# Altium footprint library modules.PcbLib: 20 footprints (part 2 of 2)
Each footprint in its own frame and in the unit in brackets; x right, y up, seen from the top. Pads: shape width x height; smd on the part's side, far side on the other; paste and mask are expansions set on the pad; w line width, h text height; cw(c..) or ccw(c..) is an arc to the next point about the centre after c.
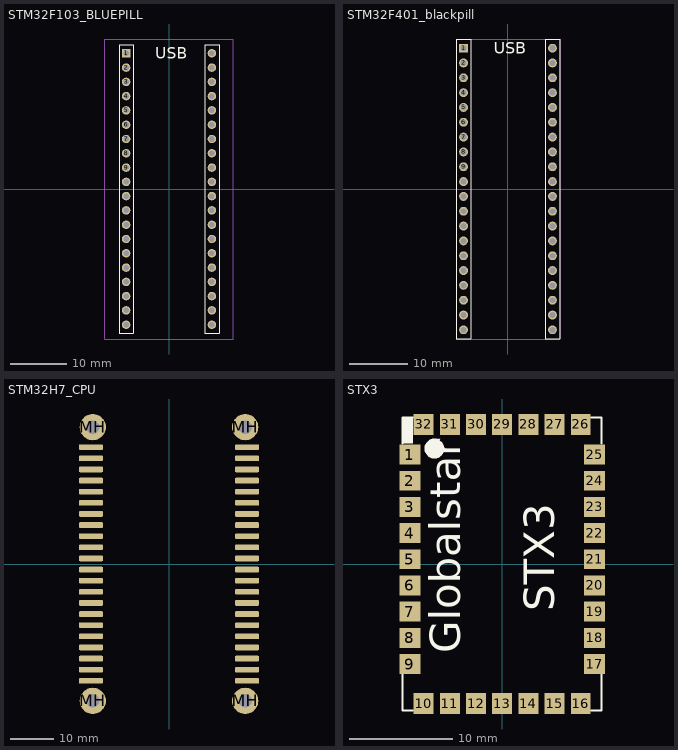
[diagram p1: the footprints below, top view; thin cyan lines are the x and y axes]

## STM32F103_BLUEPILL [mm]
pads (40):
  rect 1.508x1.508 hole 1: 1(-7.62,24.13)
  round 1.508 hole 1: 2(-7.62,21.59) 3(-7.62,19.05) 4(-7.62,16.51) 5(-7.62,13.97) 6(-7.62,11.43) 7(-7.62,8.89) 8(-7.62,6.35) 9(-7.62,3.81) 10(-7.62,1.27) 11(-7.62,-1.27) 12(-7.62,-3.81) 13(-7.62,-6.35) 14(-7.62,-8.89) 15(-7.62,-11.43) 16(-7.62,-13.97) 17(-7.62,-16.51) 18(-7.62,-19.05) 19(-7.62,-21.59) 20(-7.62,-24.13) 21(7.62,-24.13) 22(7.62,-21.59) 23(7.62,-19.05) 24(7.62,-16.51) 25(7.62,-13.97) 26(7.62,-11.43) 27(7.62,-8.89) 28(7.62,-6.35) 29(7.62,-3.81) 30(7.62,-1.27) 31(7.62,1.27) 32(7.62,3.81) 33(7.62,6.35) 34(7.62,8.89) 35(7.62,11.43) 36(7.62,13.97) 37(7.62,16.51) 38(7.62,19.05) 39(7.62,21.59) 40(7.62,24.13)
Top Overlay:
  lines w0.127: -8.89,-25.673 -8.89,25.688 -6.35,25.688 -6.35,-25.673 -8.89,-25.673 ; 6.35,-25.673 6.35,25.688 8.89,25.688 8.89,-25.673 6.35,-25.673
  text "USB" at -2.437,23.182 h2
Top Assembly (Mech13):
  lines w0.127: -11.43,-26.67 11.43,-26.67 11.43,26.67 -11.43,26.67 -11.43,-26.67
3D body "User Library-BluePill.X_B": height 16.51, standoff -0.92, extent -11.227,-31.648 11.273,26.988
3D body "User Library-PBS_(DS1023)_1line_connectors_h=5_0_8_5mm_step_2_54mm-1.STEP": height 5, standoff -3.3, extent -8.89,-25.65 -6.39,25.65
3D body "User Library-PBS_(DS1023)_1line_connectors_h=5_0_8_5mm_step_2_54mm-1.STEP": height 5, standoff -3.3, extent 6.39,-25.65 8.89,25.65

## STM32F401_blackpill [mm]
pads (40):
  rect 1.508x1.508 hole 1: 1(-7.62,24.13)
  round 1.508 hole 1: 2(-7.62,21.59) 3(-7.62,19.05) 4(-7.62,16.51) 5(-7.62,13.97) 6(-7.62,11.43) 7(-7.62,8.89) 8(-7.62,6.35) 9(-7.62,3.81) 10(-7.62,1.27) 11(-7.62,-1.27) 12(-7.62,-3.81) 13(-7.62,-6.35) 14(-7.62,-8.89) 15(-7.62,-11.43) 16(-7.62,-13.97) 17(-7.62,-16.51) 18(-7.62,-19.05) 19(-7.62,-21.59) 20(-7.62,-24.13) 21(7.62,-24.13) 22(7.62,-21.59) 23(7.62,-19.05) 24(7.62,-16.51) 25(7.62,-13.97) 26(7.62,-11.43) 27(7.62,-8.89) 28(7.62,-6.35) 29(7.62,-3.81) 30(7.62,-1.27) 31(7.62,1.27) 32(7.62,3.81) 33(7.62,6.35) 34(7.62,8.89) 35(7.62,11.43) 36(7.62,13.97) 37(7.62,16.51) 38(7.62,19.05) 39(7.62,21.59) 40(7.62,24.13)
Top Overlay:
  lines w0.127: -8.89,-25.673 -8.89,25.688 -6.35,25.688 -6.35,-25.673 -8.89,-25.673 ; 6.35,-25.673 6.35,25.688 8.89,25.688 8.89,-25.673 6.35,-25.673
  text "USB" at -2.437,23.182 h2
Top Assembly (Mech13):
  lines w0.127: -8.9,-25.7 -8.9,25.7 8.9,25.7 8.9,-25.7 -8.9,-25.7
3D body "User Library-BluePill.X_B": height 16.51, standoff -0.92, extent -11.227,-31.648 11.273,26.988
3D body "User Library-PBS_(DS1023)_1line_connectors_h=5_0_8_5mm_step_2_54mm-1.STEP": height 5, standoff -3.3, extent -8.89,-25.65 -6.39,25.65
3D body "User Library-PBS_(DS1023)_1line_connectors_h=5_0_8_5mm_step_2_54mm-1.STEP": height 5, standoff -3.3, extent 6.39,-25.65 8.89,25.65

## STM32H7_CPU [mm]
pads (92):
  rrect50% 3x1.3 smd: 1(-19.091,26.67) 2(-16.551,26.67) 3(-19.091,24.13) 4(-16.551,24.13) 5(-19.091,21.59) 6(-16.551,21.59) 7(-19.091,19.05) 8(-16.551,19.05) 9(-19.091,16.51) 10(-16.551,16.51) 11(-19.091,13.97) 12(-16.551,13.97) 13(-19.091,11.43) 14(-16.551,11.43) 15(-19.091,8.89) 16(-16.551,8.89) 17(-19.091,6.35) 18(-16.551,6.35) 19(-19.091,3.81) 20(-16.551,3.81) 21(-19.091,1.27) 22(-16.551,1.27) 23(-19.091,-1.27) 24(-16.551,-1.27) 25(-19.091,-3.81) 26(-16.551,-3.81) 27(-19.091,-6.35) 28(-16.551,-6.35) 29(-19.091,-8.89) 30(-16.551,-8.89) 31(-19.091,-11.43) 32(-16.551,-11.43) 33(-19.091,-13.97) 34(-16.551,-13.97) 35(-19.091,-16.51) 36(-16.551,-16.51) 37(-19.091,-19.05) 38(-16.551,-19.05) 39(-19.091,-21.59) 40(-16.551,-21.59) 41(-19.091,-24.13) 42(-16.551,-24.13) 43(-19.091,-26.67) 44(-16.551,-26.67) 45(16.551,26.67) 46(19.091,26.67) 47(16.551,24.13) 48(19.091,24.13) 49(16.551,21.59) 50(19.091,21.59) 51(16.551,19.05) 52(19.091,19.05) 53(16.551,16.51) 54(19.091,16.51) 55(16.551,13.97) 56(19.091,13.97) 57(16.551,11.43) 58(19.091,11.43) 59(16.551,8.89) 60(19.091,8.89) 61(16.551,6.35) 62(19.091,6.35) 63(16.551,3.81) 64(19.091,3.81) 65(16.551,1.27) 66(19.091,1.27) 67(16.551,-1.27) 68(19.091,-1.27) 69(16.551,-3.81) 70(19.091,-3.81) 71(16.551,-6.35) 72(19.091,-6.35) 73(16.551,-8.89) 74(19.091,-8.89) 75(16.551,-11.43) 76(19.091,-11.43) 77(16.551,-13.97) 78(19.091,-13.97) 79(16.551,-16.51) 80(19.091,-16.51) 81(16.551,-19.05) 82(19.091,-19.05) 83(16.551,-21.59) 84(19.091,-21.59) 85(16.551,-24.13) 86(19.091,-24.13) 87(16.551,-26.67) 88(19.091,-26.67)
  round 6 hole 3.12: MH(-17.395,-31.24) MH(-17.395,31.24) MH(17.395,-31.24) MH(17.395,31.24)
3D body "pcb_connector_803-83-044-30-001101.stp": height 8.5, standoff -0.1, extent -21.271,-27.94 -14.371,27.94
3D body "pcb_connector_803-83-044-30-001101.stp": height 8.5, standoff -0.1, extent 14.371,-27.94 21.271,27.94
3D body "SMT32H7(50VBT6)_DevEBox_Board.SLDPRT": height 12.5, standoff 0.9, extent -20.505,-35.379 20.495,35.371

## STX3 [mil]
pads (32):
  rect 80x76 smd: 1(-353,418) 2(-353,318) 3(-353,218) 4(-353,118) 5(-353,18) 6(-353,-82) 7(-353,-182) 8(-353,-282) 9(-353,-382) 17(353,-382) 18(353,-282) 19(353,-182) 20(353,-82) 21(353,18) 22(353,118) 23(353,218) 24(353,318) 25(353,418)
  rect 76x80 smd: 10(-300,-533) 11(-200,-533) 12(-100,-533) 13(0,-533) 14(100,-533) 15(200,-533) 16(300,-533) 26(300,533) 27(200,533) 28(100,533) 29(0,533) 30(-100,533) 31(-200,533) 32(-300,533)
Top Overlay:
  circle w40: c-259.11,440.93 r17.82
  rectangle: -380,460 -340,560
  lines w7.87: -380,-420 -380,-560 -340,-560 ; -380,460 -380,560 -340,560 ; 340,-560 380,-560 380,-420 ; 340,560 380,560 380,460
  text "Globalstar" at -122.59,-340 h200
  text "STX3" at 237.41,-180 h200